# Altium schematic symbol library jlcpcb_2025_04_capacitors_extended_0603.schlib: 3668 symbols (part 20 of 20) (continued)
## V106M0603X5R250NKT
designator C?  Capacitance: 10uF  (hidden comment: *)
Capacitor, Ceramic (MLCC), 10uF, 25V, X5R, SMD 0603; Manufacturer: VIIYONG; Manufacturer Part Number: V106M0603X5R250NKT; Package Size: 0603; JLCPCB Basic Part: No; JLCPCB Part Number: C5240381; Supplier 1: LCSC; Category: Capacitors - MLCC; Supplier Part Number 1: C5240381; Voltage Rating: 25V; Temperature Coefficient: X5R; RoHS: Yes; ComponentLink1Description: Datasheet; ComponentLink1URL: https://wmsc.lcsc.com/wmsc/upload/file/pdf/v2/lcsc/2210281800_VIIYONG-V106M0603X5R250NKT_C5240381.pdf; ComponentLink2Description: JLCPCB Part URL; ComponentLink2URL: https://jlcpcb.com/partdetail/C5240381; ComponentLink3Description: LCSC Part URL; ComponentLink3URL: https://lcsc.com/product-detail/Multilayer-Ceramic-Capacitors-MLCC---SMD-SMT_VIIYONG-VIIYONG-V106M0603X5R250NKT_C5240381.html
footprint CAP-0603 (0603 (1608M) Capacitor)
pins: 1, 2

## V225K0603X5R160NDT
designator C?  Capacitance: 2.2uF  (hidden comment: *)
Capacitor, Ceramic (MLCC), 2.2uF, 16V, SMD 0603; Manufacturer: VIIYONG; Manufacturer Part Number: V225K0603X5R160NDT; Package Size: 0603; JLCPCB Basic Part: No; JLCPCB Part Number: C2691406; Supplier 1: LCSC; Category: Capacitors - MLCC; Supplier Part Number 1: C2691406; Voltage Rating: 16V; RoHS: Yes; ComponentLink1Description: Datasheet; ComponentLink1URL: https://wmsc.lcsc.com/wmsc/upload/file/pdf/v2/lcsc/2304140030_VIIYONG-V225K0603X5R160NDT_C2691406.pdf; ComponentLink2Description: JLCPCB Part URL; ComponentLink2URL: https://jlcpcb.com/partdetail/C2691406; ComponentLink3Description: LCSC Part URL; ComponentLink3URL: https://lcsc.com/product-detail/Multilayer-Ceramic-Capacitors-MLCC---SMD-SMT_VIIYONG-VIIYONG-V225K0603X5R160NDT_C2691406.html
footprint CAP-0603 (0603 (1608M) Capacitor)
pins: 1, 2

## V226M0603X5R6R3NKT
designator C?  Capacitance: 22uF  (hidden comment: *)
Capacitor, Ceramic (MLCC), 22uF, ±20%, 6.3V, X5R, ±20%, SMD 0603; Manufacturer: VIIYONG; Manufacturer Part Number: V226M0603X5R6R3NKT; Package Size: 0603; JLCPCB Basic Part: No; JLCPCB Part Number: C2975902; Supplier 1: LCSC; Category: Capacitors - MLCC; Supplier Part Number 1: C2975902; Tolerance: ±20%; Voltage Rating: 6.3V; Temperature Coefficient: X5R; RoHS: Yes; ComponentLink1Description: Datasheet; ComponentLink1URL: https://wmsc.lcsc.com/wmsc/upload/file/pdf/v2/lcsc/2202181430_VIIYONG-V226M0603X5R6R3NKT_C2975902.pdf; ComponentLink2Description: JLCPCB Part URL; ComponentLink2URL: https://jlcpcb.com/partdetail/C2975902; ComponentLink3Description: LCSC Part URL; ComponentLink3URL: https://lcsc.com/product-detail/Multilayer-Ceramic-Capacitors-MLCC---SMD-SMT_VIIYONG-VIIYONG-V226M0603X5R6R3NKT_C2975902.html
footprint CAP-0603 (0603 (1608M) Capacitor)
pins: 1, 2

## V226M0603X5R100N4R
designator C?  Capacitance: 22uF  (hidden comment: *)
Capacitor, Ceramic (MLCC), 22uF, 10V, X5R, SMD 0603; Manufacturer: VIIYONG; Manufacturer Part Number: V226M0603X5R100N4R; Package Size: 0603; JLCPCB Basic Part: No; JLCPCB Part Number: C2980393; Supplier 1: LCSC; Category: Capacitors - MLCC; Supplier Part Number 1: C2980393; Voltage Rating: 10V; Temperature Coefficient: X5R; RoHS: Yes; ComponentLink1Description: Datasheet; ComponentLink1URL: https://wmsc.lcsc.com/wmsc/upload/file/pdf/v2/lcsc/2203071730_VIIYONG-V226M0603X5R100N4R_C2980393.pdf; ComponentLink2Description: JLCPCB Part URL; ComponentLink2URL: https://jlcpcb.com/partdetail/C2980393; ComponentLink3Description: LCSC Part URL; ComponentLink3URL: https://lcsc.com/product-detail/Multilayer-Ceramic-Capacitors-MLCC---SMD-SMT_VIIYONG-VIIYONG-V226M0603X5R100N4R_C2980393.html
footprint CAP-0603 (0603 (1608M) Capacitor)
pins: 1, 2

## V226M0603X5R100NKT
designator C?  Capacitance: 22uF  (hidden comment: *)
Capacitor, Ceramic (MLCC), 22uF, 10V, X5R, SMD 0603; Manufacturer: VIIYONG; Manufacturer Part Number: V226M0603X5R100NKT; Package Size: 0603; JLCPCB Basic Part: No; JLCPCB Part Number: C5240384; Supplier 1: LCSC; Category: Capacitors - MLCC; Supplier Part Number 1: C5240384; Voltage Rating: 10V; Temperature Coefficient: X5R; RoHS: Yes; ComponentLink1Description: Datasheet; ComponentLink1URL: https://wmsc.lcsc.com/wmsc/upload/file/pdf/v2/lcsc/2210281800_VIIYONG-V226M0603X5R100NKT_C5240384.pdf; ComponentLink2Description: JLCPCB Part URL; ComponentLink2URL: https://jlcpcb.com/partdetail/C5240384; ComponentLink3Description: LCSC Part URL; ComponentLink3URL: https://lcsc.com/product-detail/Multilayer-Ceramic-Capacitors-MLCC---SMD-SMT_VIIYONG-VIIYONG-V226M0603X5R100NKT_C5240384.html
footprint CAP-0603 (0603 (1608M) Capacitor)
pins: 1, 2

## V226M0603X6S6R3NWR
designator C?  Capacitance: 22uF  (hidden comment: *)
Capacitor, Ceramic (MLCC), 22uF, ±20%, 6.3V, X6S, ±20%, SMD 0603; Manufacturer: VIIYONG; Manufacturer Part Number: V226M0603X6S6R3NWR; Package Size: 0603; JLCPCB Basic Part: No; JLCPCB Part Number: C3009907; Supplier 1: LCSC; Category: Capacitors - MLCC; Supplier Part Number 1: C3009907; Tolerance: ±20%; Voltage Rating: 6.3V; Temperature Coefficient: X6S; RoHS: Yes; ComponentLink1Description: Datasheet; ComponentLink1URL: https://wmsc.lcsc.com/wmsc/upload/file/pdf/v2/lcsc/2205171745_VIIYONG-V226M0603X6S6R3NWR_C3009907.pdf; ComponentLink2Description: JLCPCB Part URL; ComponentLink2URL: https://jlcpcb.com/partdetail/C3009907; ComponentLink3Description: LCSC Part URL; ComponentLink3URL: https://lcsc.com/product-detail/Multilayer-Ceramic-Capacitors-MLCC---SMD-SMT_VIIYONG-VIIYONG-V226M0603X6S6R3NWR_C3009907.html
footprint CAP-0603 (0603 (1608M) Capacitor)
pins: 1, 2

## V475K0603X5R6R3NDT
designator C?  Capacitance: 4.7uF  (hidden comment: *)
Capacitor, Ceramic (MLCC), 4.7uF, 6.3V, X5R, SMD 0603; Manufacturer: VIIYONG; Manufacturer Part Number: V475K0603X5R6R3NDT; Package Size: 0603; JLCPCB Basic Part: No; JLCPCB Part Number: C5240386; Supplier 1: LCSC; Category: Capacitors - MLCC; Supplier Part Number 1: C5240386; Voltage Rating: 6.3V; Temperature Coefficient: X5R; RoHS: Yes; ComponentLink1Description: Datasheet; ComponentLink1URL: https://wmsc.lcsc.com/wmsc/upload/file/pdf/v2/lcsc/2210281800_VIIYONG-V475K0603X5R6R3NDT_C5240386.pdf; ComponentLink2Description: JLCPCB Part URL; ComponentLink2URL: https://jlcpcb.com/partdetail/C5240386; ComponentLink3Description: LCSC Part URL; ComponentLink3URL: https://lcsc.com/product-detail/Multilayer-Ceramic-Capacitors-MLCC---SMD-SMT_VIIYONG-VIIYONG-V475K0603X5R6R3NDT_C5240386.html
footprint CAP-0603 (0603 (1608M) Capacitor)
pins: 1, 2

## V475K0603X5R100NDT
designator C?  Capacitance: 4.7uF  (hidden comment: *)
Capacitor, Ceramic (MLCC), 4.7uF, 10V, X5R, SMD 0603; Manufacturer: VIIYONG; Manufacturer Part Number: V475K0603X5R100NDT; Package Size: 0603; JLCPCB Basic Part: No; JLCPCB Part Number: C2980395; Supplier 1: LCSC; Category: Capacitors - MLCC; Supplier Part Number 1: C2980395; Voltage Rating: 10V; Temperature Coefficient: X5R; RoHS: Yes; ComponentLink1Description: Datasheet; ComponentLink1URL: https://wmsc.lcsc.com/wmsc/upload/file/pdf/v2/lcsc/2203041530_VIIYONG-V475K0603X5R100NDT_C2980395.pdf; ComponentLink2Description: JLCPCB Part URL; ComponentLink2URL: https://jlcpcb.com/partdetail/C2980395; ComponentLink3Description: LCSC Part URL; ComponentLink3URL: https://lcsc.com/product-detail/Multilayer-Ceramic-Capacitors-MLCC---SMD-SMT_VIIYONG-VIIYONG-V475K0603X5R100NDT_C2980395.html
footprint CAP-0603 (0603 (1608M) Capacitor)
pins: 1, 2

## V475K0603X5R160NDT
designator C?  Capacitance: 4.7uF  (hidden comment: *)
Capacitor, Ceramic (MLCC), 4.7uF, 16V, X5R, SMD 0603; Manufacturer: VIIYONG; Manufacturer Part Number: V475K0603X5R160NDT; Package Size: 0603; JLCPCB Basic Part: No; JLCPCB Part Number: C2980396; Supplier 1: LCSC; Category: Capacitors - MLCC; Supplier Part Number 1: C2980396; Voltage Rating: 16V; Temperature Coefficient: X5R; RoHS: Yes; ComponentLink1Description: Datasheet; ComponentLink1URL: https://wmsc.lcsc.com/wmsc/upload/file/pdf/v2/lcsc/2203041530_VIIYONG-V475K0603X5R160NDT_C2980396.pdf; ComponentLink2Description: JLCPCB Part URL; ComponentLink2URL: https://jlcpcb.com/partdetail/C2980396; ComponentLink3Description: LCSC Part URL; ComponentLink3URL: https://lcsc.com/product-detail/Multilayer-Ceramic-Capacitors-MLCC---SMD-SMT_VIIYONG-VIIYONG-V475K0603X5R160NDT_C2980396.html
footprint CAP-0603 (0603 (1608M) Capacitor)
pins: 1, 2

## V475K0603X7R6R3NET
designator C?  Capacitance: 4.7uF  (hidden comment: *)
Capacitor, Ceramic (MLCC), 4.7uF, ±10%, 6.3V, X7R, ±10%, SMD 0603; Manufacturer: VIIYONG; Manufacturer Part Number: V475K0603X7R6R3NET; Package Size: 0603; JLCPCB Basic Part: No; JLCPCB Part Number: C2976057; Supplier 1: LCSC; Category: Capacitors - MLCC; Supplier Part Number 1: C2976057; Tolerance: ±10%; Voltage Rating: 6.3V; Temperature Coefficient: X7R; RoHS: Yes; ComponentLink1Description: Datasheet; ComponentLink1URL: https://wmsc.lcsc.com/wmsc/upload/file/pdf/v2/lcsc/2202211830_VIIYONG-V475K0603X7R6R3NET_C2976057.pdf; ComponentLink2Description: JLCPCB Part URL; ComponentLink2URL: https://jlcpcb.com/partdetail/C2976057; ComponentLink3Description: LCSC Part URL; ComponentLink3URL: https://lcsc.com/product-detail/Multilayer-Ceramic-Capacitors-MLCC---SMD-SMT_VIIYONG-VIIYONG-V475K0603X7R6R3NET_C2976057.html
footprint CAP-0603 (0603 (1608M) Capacitor)
pins: 1, 2

## V475M0603X5R6R3NDT
designator C?  Capacitance: 4.7uF  (hidden comment: *)
Capacitor, Ceramic (MLCC), 4.7uF, ±20%, 6.3V, X5R, ±20%, SMD 0603; Manufacturer: VIIYONG; Manufacturer Part Number: V475M0603X5R6R3NDT; Package Size: 0603; JLCPCB Basic Part: No; JLCPCB Part Number: C5252399; Supplier 1: LCSC; Category: Capacitors - MLCC; Supplier Part Number 1: C5252399; Tolerance: ±20%; Voltage Rating: 6.3V; Temperature Coefficient: X5R; RoHS: Yes; ComponentLink1Description: Datasheet; ComponentLink1URL: https://wmsc.lcsc.com/wmsc/upload/file/pdf/v2/lcsc/2211101800_VIIYONG-V475M0603X5R6R3NDT_C5252399.pdf; ComponentLink2Description: JLCPCB Part URL; ComponentLink2URL: https://jlcpcb.com/partdetail/C5252399; ComponentLink3Description: LCSC Part URL; ComponentLink3URL: https://lcsc.com/product-detail/Multilayer-Ceramic-Capacitors-MLCC---SMD-SMT_VIIYONG-VIIYONG-V475M0603X5R6R3NDT_C5252399.html
footprint CAP-0603 (0603 (1608M) Capacitor)
pins: 1, 2

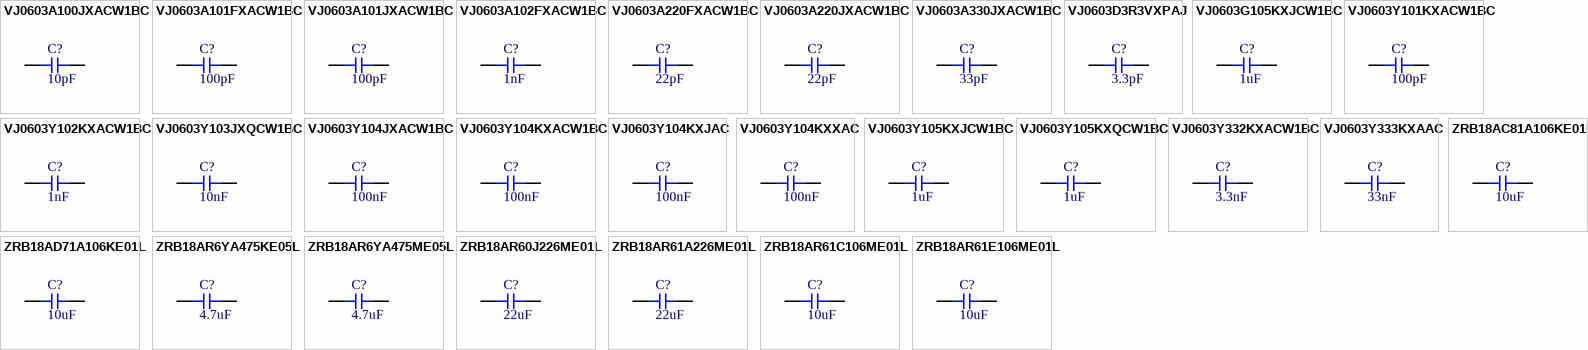
[diagram p91: symbols VJ0603A100JXACW1BC to ZRB18AR61E106ME01L]

## VJ0603A100JXACW1BC
designator C?  Capacitance: 10pF  (hidden comment: *)
Capacitor, Ceramic (MLCC), 10pF, ±5%, 50V, C0G, ±5%, SMD 0603; Manufacturer: Vishay Intertech; Manufacturer Part Number: VJ0603A100JXACW1BC; Package Size: 0603; JLCPCB Basic Part: No; JLCPCB Part Number: C2171298; Supplier 1: LCSC; Category: Capacitors - MLCC; Supplier Part Number 1: C2171298; Tolerance: ±5%; Voltage Rating: 50V; Temperature Coefficient: C0G; RoHS: Yes; ComponentLink1Description: Datasheet; ComponentLink1URL: https://wmsc.lcsc.com/wmsc/upload/file/pdf/v2/lcsc/2304140030_Vishay-Intertech-VJ0603A100JXACW1BC_C2171298.pdf; ComponentLink2Description: JLCPCB Part URL; ComponentLink2URL: https://jlcpcb.com/partdetail/C2171298; ComponentLink3Description: LCSC Part URL; ComponentLink3URL: https://lcsc.com/product-detail/Multilayer-Ceramic-Capacitors-MLCC---SMD-SMT_Vishay-Intertech-Vishay-Intertech-VJ0603A100JXACW1BC_C2171298.html
footprint CAP-0603 (0603 (1608M) Capacitor)
pins: 1, 2

## VJ0603A101FXACW1BC
designator C?  Capacitance: 100pF  (hidden comment: *)
Capacitor, Ceramic (MLCC), 100pF, ±1%, 50V, C0G, ±1%, SMD 0603; Manufacturer: Vishay Intertech; Manufacturer Part Number: VJ0603A101FXACW1BC; Package Size: 0603; JLCPCB Basic Part: No; JLCPCB Part Number: C2180415; Supplier 1: LCSC; Category: Capacitors - MLCC; Supplier Part Number 1: C2180415; Tolerance: ±1%; Voltage Rating: 50V; Temperature Coefficient: C0G; RoHS: Yes; ComponentLink1Description: Datasheet; ComponentLink1URL: https://wmsc.lcsc.com/wmsc/upload/file/pdf/v2/lcsc/2304140030_Vishay-Intertech-VJ0603A101FXACW1BC_C2180415.pdf; ComponentLink2Description: JLCPCB Part URL; ComponentLink2URL: https://jlcpcb.com/partdetail/C2180415; ComponentLink3Description: LCSC Part URL; ComponentLink3URL: https://lcsc.com/product-detail/Multilayer-Ceramic-Capacitors-MLCC---SMD-SMT_Vishay-Intertech-Vishay-Intertech-VJ0603A101FXACW1BC_C2180415.html
footprint CAP-0603 (0603 (1608M) Capacitor)
pins: 1, 2

## VJ0603A101JXACW1BC
designator C?  Capacitance: 100pF  (hidden comment: *)
Capacitor, Ceramic (MLCC), 100pF, ±5%, 50V, NP0, ±5%, SMD 0603; Manufacturer: Vishay Intertech; Manufacturer Part Number: VJ0603A101JXACW1BC; Package Size: 0603; JLCPCB Basic Part: No; JLCPCB Part Number: C3151700; Supplier 1: LCSC; Category: Capacitors - MLCC; Supplier Part Number 1: C3151700; Tolerance: ±5%; Voltage Rating: 50V; Temperature Coefficient: NP0; RoHS: Yes; ComponentLink1Description: Datasheet; ComponentLink1URL: https://wmsc.lcsc.com/wmsc/upload/file/pdf/v2/lcsc/2206291701_Vishay-Intertech-VJ0603A101JXACW1BC_C3151700.pdf; ComponentLink2Description: JLCPCB Part URL; ComponentLink2URL: https://jlcpcb.com/partdetail/C3151700; ComponentLink3Description: LCSC Part URL; ComponentLink3URL: https://lcsc.com/product-detail/Multilayer-Ceramic-Capacitors-MLCC---SMD-SMT_Vishay-Intertech-Vishay-Intertech-VJ0603A101JXACW1BC_C3151700.html
footprint CAP-0603 (0603 (1608M) Capacitor)
pins: 1, 2

## VJ0603A102FXACW1BC
designator C?  Capacitance: 1nF  (hidden comment: *)
Capacitor, Ceramic (MLCC), 1nF, ±1%, 50V, C0G, ±1%, SMD 0603; Manufacturer: Vishay Intertech; Manufacturer Part Number: VJ0603A102FXACW1BC; Package Size: 0603; JLCPCB Basic Part: No; JLCPCB Part Number: C2174671; Supplier 1: LCSC; Category: Capacitors - MLCC; Supplier Part Number 1: C2174671; Tolerance: ±1%; Voltage Rating: 50V; Temperature Coefficient: C0G; RoHS: Yes; ComponentLink1Description: Datasheet; ComponentLink1URL: https://wmsc.lcsc.com/wmsc/upload/file/pdf/v2/lcsc/2304140030_Vishay-Intertech-VJ0603A102FXACW1BC_C2174671.pdf; ComponentLink2Description: JLCPCB Part URL; ComponentLink2URL: https://jlcpcb.com/partdetail/C2174671; ComponentLink3Description: LCSC Part URL; ComponentLink3URL: https://lcsc.com/product-detail/Multilayer-Ceramic-Capacitors-MLCC---SMD-SMT_Vishay-Intertech-Vishay-Intertech-VJ0603A102FXACW1BC_C2174671.html
footprint CAP-0603 (0603 (1608M) Capacitor)
pins: 1, 2

## VJ0603A220FXACW1BC
designator C?  Capacitance: 22pF  (hidden comment: *)
Capacitor, Ceramic (MLCC), 22pF, ±1%, 50V, C0G, ±1%, SMD 0603; Manufacturer: Vishay Intertech; Manufacturer Part Number: VJ0603A220FXACW1BC; Package Size: 0603; JLCPCB Basic Part: No; JLCPCB Part Number: C2182228; Supplier 1: LCSC; Category: Capacitors - MLCC; Supplier Part Number 1: C2182228; Tolerance: ±1%; Voltage Rating: 50V; Temperature Coefficient: C0G; RoHS: Yes; ComponentLink1Description: Datasheet; ComponentLink1URL: https://wmsc.lcsc.com/wmsc/upload/file/pdf/v2/lcsc/2304140030_Vishay-Intertech-VJ0603A220FXACW1BC_C2182228.pdf; ComponentLink2Description: JLCPCB Part URL; ComponentLink2URL: https://jlcpcb.com/partdetail/C2182228; ComponentLink3Description: LCSC Part URL; ComponentLink3URL: https://lcsc.com/product-detail/Multilayer-Ceramic-Capacitors-MLCC---SMD-SMT_Vishay-Intertech-Vishay-Intertech-VJ0603A220FXACW1BC_C2182228.html
footprint CAP-0603 (0603 (1608M) Capacitor)
pins: 1, 2

## VJ0603A220JXACW1BC
designator C?  Capacitance: 22pF  (hidden comment: *)
Capacitor, Ceramic (MLCC), 22pF, ±5%, 50V, C0G, ±5%, SMD 0603; Manufacturer: Vishay Intertech; Manufacturer Part Number: VJ0603A220JXACW1BC; Package Size: 0603; JLCPCB Basic Part: No; JLCPCB Part Number: C2168905; Supplier 1: LCSC; Category: Capacitors - MLCC; Supplier Part Number 1: C2168905; Tolerance: ±5%; Voltage Rating: 50V; Temperature Coefficient: C0G; RoHS: Yes; ComponentLink1Description: Datasheet; ComponentLink1URL: https://wmsc.lcsc.com/wmsc/upload/file/pdf/v2/lcsc/2304140030_Vishay-Intertech-VJ0603A220JXACW1BC_C2168905.pdf; ComponentLink2Description: JLCPCB Part URL; ComponentLink2URL: https://jlcpcb.com/partdetail/C2168905; ComponentLink3Description: LCSC Part URL; ComponentLink3URL: https://lcsc.com/product-detail/Multilayer-Ceramic-Capacitors-MLCC---SMD-SMT_Vishay-Intertech-Vishay-Intertech-VJ0603A220JXACW1BC_C2168905.html
footprint CAP-0603 (0603 (1608M) Capacitor)
pins: 1, 2

## VJ0603A330JXACW1BC
designator C?  Capacitance: 33pF  (hidden comment: *)
Capacitor, Ceramic (MLCC), 33pF, ±5%, 50V, C0G, ±5%, SMD 0603; Manufacturer: Vishay Intertech; Manufacturer Part Number: VJ0603A330JXACW1BC; Package Size: 0603; JLCPCB Basic Part: No; JLCPCB Part Number: C3878228; Supplier 1: LCSC; Category: Capacitors - MLCC; Supplier Part Number 1: C3878228; Tolerance: ±5%; Voltage Rating: 50V; Temperature Coefficient: C0G; RoHS: Yes; ComponentLink1Description: Datasheet; ComponentLink1URL: https://wmsc.lcsc.com/wmsc/upload/file/pdf/v2/lcsc/2312121652_Vishay-Intertech-VJ0603A330JXACW1BC_C3878228.pdf; ComponentLink2Description: JLCPCB Part URL; ComponentLink2URL: https://jlcpcb.com/partdetail/C3878228; ComponentLink3Description: LCSC Part URL; ComponentLink3URL: https://lcsc.com/product-detail/Multilayer-Ceramic-Capacitors-MLCC---SMD-SMT_Vishay-Intertech-Vishay-Intertech-VJ0603A330JXACW1BC_C3878228.html
footprint CAP-0603 (0603 (1608M) Capacitor)
pins: 1, 2

## VJ0603D3R3VXPAJ
designator C?  Capacitance: 3.3pF  (hidden comment: *)
Capacitor, Ceramic (MLCC), 3.3pF, 50V, C0G, SMD 0603; Manufacturer: Vishay Intertech; Manufacturer Part Number: VJ0603D3R3VXPAJ; Package Size: 0603; JLCPCB Basic Part: No; JLCPCB Part Number: C3000798; Supplier 1: LCSC; Category: Capacitors - MLCC; Supplier Part Number 1: C3000798; Voltage Rating: 50V; Temperature Coefficient: C0G; RoHS: Yes; ComponentLink1Description: Datasheet; ComponentLink1URL: https://wmsc.lcsc.com/wmsc/upload/file/pdf/v2/lcsc/2204251600_Vishay-Intertech-VJ0603D3R3VXPAJ_C3000798.pdf; ComponentLink2Description: JLCPCB Part URL; ComponentLink2URL: https://jlcpcb.com/partdetail/C3000798; ComponentLink3Description: LCSC Part URL; ComponentLink3URL: https://lcsc.com/product-detail/Multilayer-Ceramic-Capacitors-MLCC---SMD-SMT_Vishay-Intertech-Vishay-Intertech-VJ0603D3R3VXPAJ_C3000798.html
footprint CAP-0603 (0603 (1608M) Capacitor)
pins: 1, 2

## VJ0603G105KXJCW1BC
designator C?  Capacitance: 1uF  (hidden comment: *)
Capacitor, Ceramic (MLCC), 1uF, ±10%, 16V, X5R, ±10%, SMD 0603; Manufacturer: Vishay Intertech; Manufacturer Part Number: VJ0603G105KXJCW1BC; Package Size: 0603; JLCPCB Basic Part: No; JLCPCB Part Number: C272771; Supplier 1: LCSC; Category: Capacitors - MLCC; Supplier Part Number 1: C272771; Tolerance: ±10%; Voltage Rating: 16V; Temperature Coefficient: X5R; RoHS: Yes; ComponentLink1Description: Datasheet; ComponentLink1URL: https://wmsc.lcsc.com/wmsc/upload/file/pdf/v2/lcsc/1810051510_Vishay-Intertech-VJ0603G105KXJCW1BC_C272771.pdf; ComponentLink2Description: JLCPCB Part URL; ComponentLink2URL: https://jlcpcb.com/partdetail/C272771; ComponentLink3Description: LCSC Part URL; ComponentLink3URL: https://lcsc.com/product-detail/Multilayer-Ceramic-Capacitors-MLCC---SMD-SMT_Vishay-Intertech-Vishay-Intertech-VJ0603G105KXJCW1BC_C272771.html
footprint CAP-0603 (0603 (1608M) Capacitor)
pins: 1, 2

## VJ0603Y101KXACW1BC
designator C?  Capacitance: 100pF  (hidden comment: *)
Capacitor, Ceramic (MLCC), 100pF, ±10%, 50V, X7R, ±10%, SMD 0603; Manufacturer: Vishay Intertech; Manufacturer Part Number: VJ0603Y101KXACW1BC; Package Size: 0603; JLCPCB Basic Part: No; JLCPCB Part Number: C2169528; Supplier 1: LCSC; Category: Capacitors - MLCC; Supplier Part Number 1: C2169528; Tolerance: ±10%; Voltage Rating: 50V; Temperature Coefficient: X7R; RoHS: Yes; ComponentLink1Description: Datasheet; ComponentLink1URL: https://wmsc.lcsc.com/wmsc/upload/file/pdf/v2/lcsc/2304140030_Vishay-Intertech-VJ0603Y101KXACW1BC_C2169528.pdf; ComponentLink2Description: JLCPCB Part URL; ComponentLink2URL: https://jlcpcb.com/partdetail/C2169528; ComponentLink3Description: LCSC Part URL; ComponentLink3URL: https://lcsc.com/product-detail/Multilayer-Ceramic-Capacitors-MLCC---SMD-SMT_Vishay-Intertech-Vishay-Intertech-VJ0603Y101KXACW1BC_C2169528.html
footprint CAP-0603 (0603 (1608M) Capacitor)
pins: 1, 2

## VJ0603Y102KXACW1BC
designator C?  Capacitance: 1nF  (hidden comment: *)
Capacitor, Ceramic (MLCC), 1nF, ±10%, 50V, X7R, ±10%, SMD 0603; Manufacturer: Vishay Intertech; Manufacturer Part Number: VJ0603Y102KXACW1BC; Package Size: 0603; JLCPCB Basic Part: No; JLCPCB Part Number: C153794; Supplier 1: LCSC; Category: Capacitors - MLCC; Supplier Part Number 1: C153794; Tolerance: ±10%; Voltage Rating: 50V; Temperature Coefficient: X7R; RoHS: Yes; ComponentLink1Description: Datasheet; ComponentLink1URL: https://wmsc.lcsc.com/wmsc/upload/file/pdf/v2/lcsc/2304140030_Vishay-Intertech-VJ0603Y102KXACW1BC_C153794.pdf; ComponentLink2Description: JLCPCB Part URL; ComponentLink2URL: https://jlcpcb.com/partdetail/C153794; ComponentLink3Description: LCSC Part URL; ComponentLink3URL: https://lcsc.com/product-detail/Multilayer-Ceramic-Capacitors-MLCC---SMD-SMT_Vishay-Intertech-Vishay-Intertech-VJ0603Y102KXACW1BC_C153794.html
footprint CAP-0603 (0603 (1608M) Capacitor)
pins: 1, 2

## VJ0603Y103JXQCW1BC
designator C?  Capacitance: 10nF  (hidden comment: *)
Capacitor, Ceramic (MLCC), 10nF, ±5%, 10V, X7R, ±5%, SMD 0603; Manufacturer: Vishay Intertech; Manufacturer Part Number: VJ0603Y103JXQCW1BC; Package Size: 0603; JLCPCB Basic Part: No; JLCPCB Part Number: C3000826; Supplier 1: LCSC; Category: Capacitors - MLCC; Supplier Part Number 1: C3000826; Tolerance: ±5%; Voltage Rating: 10V; Temperature Coefficient: X7R; RoHS: Yes; ComponentLink1Description: Datasheet; ComponentLink1URL: https://wmsc.lcsc.com/wmsc/upload/file/pdf/v2/lcsc/2204251600_Vishay-Intertech-VJ0603Y103JXQCW1BC_C3000826.pdf; ComponentLink2Description: JLCPCB Part URL; ComponentLink2URL: https://jlcpcb.com/partdetail/C3000826; ComponentLink3Description: LCSC Part URL; ComponentLink3URL: https://lcsc.com/product-detail/Multilayer-Ceramic-Capacitors-MLCC---SMD-SMT_Vishay-Intertech-Vishay-Intertech-VJ0603Y103JXQCW1BC_C3000826.html
footprint CAP-0603 (0603 (1608M) Capacitor)
pins: 1, 2

## VJ0603Y104JXACW1BC
designator C?  Capacitance: 100nF  (hidden comment: *)
Capacitor, Ceramic (MLCC), 100nF, ±5%, 50V, X7R, ±5%, SMD 0603; Manufacturer: Vishay Intertech; Manufacturer Part Number: VJ0603Y104JXACW1BC; Package Size: 0603; JLCPCB Basic Part: No; JLCPCB Part Number: C167641; Supplier 1: LCSC; Category: Capacitors - MLCC; Supplier Part Number 1: C167641; Tolerance: ±5%; Voltage Rating: 50V; Temperature Coefficient: X7R; RoHS: Yes; ComponentLink1Description: Datasheet; ComponentLink1URL: https://wmsc.lcsc.com/wmsc/upload/file/pdf/v2/lcsc/1809291528_Vishay-Intertech-VJ0603Y104JXACW1BC_C167641.pdf; ComponentLink2Description: JLCPCB Part URL; ComponentLink2URL: https://jlcpcb.com/partdetail/C167641; ComponentLink3Description: LCSC Part URL; ComponentLink3URL: https://lcsc.com/product-detail/Multilayer-Ceramic-Capacitors-MLCC---SMD-SMT_Vishay-Intertech-Vishay-Intertech-VJ0603Y104JXACW1BC_C167641.html
footprint CAP-0603 (0603 (1608M) Capacitor)
pins: 1, 2

## VJ0603Y104KXACW1BC
designator C?  Capacitance: 100nF  (hidden comment: *)
Capacitor, Ceramic (MLCC), 100nF, ±10%, 50V, X7R, ±10%, SMD 0603; Manufacturer: Vishay Intertech; Manufacturer Part Number: VJ0603Y104KXACW1BC; Package Size: 0603; JLCPCB Basic Part: No; JLCPCB Part Number: C161854; Supplier 1: LCSC; Category: Capacitors - MLCC; Supplier Part Number 1: C161854; Tolerance: ±10%; Voltage Rating: 50V; Temperature Coefficient: X7R; RoHS: Yes; ComponentLink1Description: Datasheet; ComponentLink1URL: https://wmsc.lcsc.com/wmsc/upload/file/pdf/v2/lcsc/2304140030_Vishay-Intertech-VJ0603Y104KXACW1BC_C161854.pdf; ComponentLink2Description: JLCPCB Part URL; ComponentLink2URL: https://jlcpcb.com/partdetail/C161854; ComponentLink3Description: LCSC Part URL; ComponentLink3URL: https://lcsc.com/product-detail/Multilayer-Ceramic-Capacitors-MLCC---SMD-SMT_Vishay-Intertech-Vishay-Intertech-VJ0603Y104KXACW1BC_C161854.html
footprint CAP-0603 (0603 (1608M) Capacitor)
pins: 1, 2

## VJ0603Y104KXJAC
designator C?  Capacitance: 100nF  (hidden comment: *)
Capacitor, Ceramic (MLCC), 100nF, ±10%, 16V, X7R, ±10%, SMD 0603; Manufacturer: Vishay Intertech; Manufacturer Part Number: VJ0603Y104KXJAC; Package Size: 0603; JLCPCB Basic Part: No; JLCPCB Part Number: C165952; Supplier 1: LCSC; Category: Capacitors - MLCC; Supplier Part Number 1: C165952; Tolerance: ±10%; Voltage Rating: 16V; Temperature Coefficient: X7R; RoHS: Yes; ComponentLink1Description: Datasheet; ComponentLink1URL: https://wmsc.lcsc.com/wmsc/upload/file/pdf/v2/lcsc/1806111858_Vishay-Intertech-VJ0603Y104KXJAC_C165952.pdf; ComponentLink2Description: JLCPCB Part URL; ComponentLink2URL: https://jlcpcb.com/partdetail/C165952; ComponentLink3Description: LCSC Part URL; ComponentLink3URL: https://lcsc.com/product-detail/Multilayer-Ceramic-Capacitors-MLCC---SMD-SMT_Vishay-Intertech-Vishay-Intertech-VJ0603Y104KXJAC_C165952.html
footprint CAP-0603 (0603 (1608M) Capacitor)
pins: 1, 2

## VJ0603Y104KXXAC
designator C?  Capacitance: 100nF  (hidden comment: *)
Capacitor, Ceramic (MLCC), 100nF, ±10%, 25V, X7R, ±10%, SMD 0603; Manufacturer: Vishay Intertech; Manufacturer Part Number: VJ0603Y104KXXAC; Package Size: 0603; JLCPCB Basic Part: No; JLCPCB Part Number: C165951; Supplier 1: LCSC; Category: Capacitors - MLCC; Supplier Part Number 1: C165951; Tolerance: ±10%; Voltage Rating: 25V; Temperature Coefficient: X7R; RoHS: Yes; ComponentLink1Description: Datasheet; ComponentLink1URL: https://wmsc.lcsc.com/wmsc/upload/file/pdf/v2/lcsc/2304140030_Vishay-Intertech-VJ0603Y104KXXAC_C165951.pdf; ComponentLink2Description: JLCPCB Part URL; ComponentLink2URL: https://jlcpcb.com/partdetail/C165951; ComponentLink3Description: LCSC Part URL; ComponentLink3URL: https://lcsc.com/product-detail/Multilayer-Ceramic-Capacitors-MLCC---SMD-SMT_Vishay-Intertech-Vishay-Intertech-VJ0603Y104KXXAC_C165951.html
footprint CAP-0603 (0603 (1608M) Capacitor)
pins: 1, 2

## VJ0603Y105KXJCW1BC
designator C?  Capacitance: 1uF  (hidden comment: *)
Capacitor, Ceramic (MLCC), 1uF, ±10%, 16V, X7R, ±10%, SMD 0603; Manufacturer: Vishay Intertech; Manufacturer Part Number: VJ0603Y105KXJCW1BC; Package Size: 0603; JLCPCB Basic Part: No; JLCPCB Part Number: C2169543; Supplier 1: LCSC; Category: Capacitors - MLCC; Supplier Part Number 1: C2169543; Tolerance: ±10%; Voltage Rating: 16V; Temperature Coefficient: X7R; RoHS: Yes; ComponentLink1Description: Datasheet; ComponentLink1URL: https://wmsc.lcsc.com/wmsc/upload/file/pdf/v2/lcsc/2304140030_Vishay-Intertech-VJ0603Y105KXJCW1BC_C2169543.pdf; ComponentLink2Description: JLCPCB Part URL; ComponentLink2URL: https://jlcpcb.com/partdetail/C2169543; ComponentLink3Description: LCSC Part URL; ComponentLink3URL: https://lcsc.com/product-detail/Multilayer-Ceramic-Capacitors-MLCC---SMD-SMT_Vishay-Intertech-Vishay-Intertech-VJ0603Y105KXJCW1BC_C2169543.html
footprint CAP-0603 (0603 (1608M) Capacitor)
pins: 1, 2

## VJ0603Y105KXQCW1BC
designator C?  Capacitance: 1uF  (hidden comment: *)
Capacitor, Ceramic (MLCC), 1uF, ±10%, 10V, X7R, ±10%, SMD 0603; Manufacturer: Vishay Intertech; Manufacturer Part Number: VJ0603Y105KXQCW1BC; Package Size: 0603; JLCPCB Basic Part: No; JLCPCB Part Number: C3000819; Supplier 1: LCSC; Category: Capacitors - MLCC; Supplier Part Number 1: C3000819; Tolerance: ±10%; Voltage Rating: 10V; Temperature Coefficient: X7R; RoHS: Yes; ComponentLink1Description: Datasheet; ComponentLink1URL: https://wmsc.lcsc.com/wmsc/upload/file/pdf/v2/lcsc/2204251600_Vishay-Intertech-VJ0603Y105KXQCW1BC_C3000819.pdf; ComponentLink2Description: JLCPCB Part URL; ComponentLink2URL: https://jlcpcb.com/partdetail/C3000819; ComponentLink3Description: LCSC Part URL; ComponentLink3URL: https://lcsc.com/product-detail/Multilayer-Ceramic-Capacitors-MLCC---SMD-SMT_Vishay-Intertech-Vishay-Intertech-VJ0603Y105KXQCW1BC_C3000819.html
footprint CAP-0603 (0603 (1608M) Capacitor)
pins: 1, 2

## VJ0603Y332KXACW1BC
designator C?  Capacitance: 3.3nF  (hidden comment: *)
Capacitor, Ceramic (MLCC), 3.3nF, ±10%, 50V, X7R, ±10%, SMD 0603; Manufacturer: Vishay Intertech; Manufacturer Part Number: VJ0603Y332KXACW1BC; Package Size: 0603; JLCPCB Basic Part: No; JLCPCB Part Number: C167331; Supplier 1: LCSC; Category: Capacitors - MLCC; Supplier Part Number 1: C167331; Tolerance: ±10%; Voltage Rating: 50V; Temperature Coefficient: X7R; RoHS: Yes; ComponentLink1Description: Datasheet; ComponentLink1URL: https://wmsc.lcsc.com/wmsc/upload/file/pdf/v2/lcsc/2304140030_Vishay-Intertech-VJ0603Y332KXACW1BC_C167331.pdf; ComponentLink2Description: JLCPCB Part URL; ComponentLink2URL: https://jlcpcb.com/partdetail/C167331; ComponentLink3Description: LCSC Part URL; ComponentLink3URL: https://lcsc.com/product-detail/Multilayer-Ceramic-Capacitors-MLCC---SMD-SMT_Vishay-Intertech-Vishay-Intertech-VJ0603Y332KXACW1BC_C167331.html
footprint CAP-0603 (0603 (1608M) Capacitor)
pins: 1, 2

## VJ0603Y333KXAAC
designator C?  Capacitance: 33nF  (hidden comment: *)
Capacitor, Ceramic (MLCC), 33nF, ±10%, 50V, X7R, ±10%, SMD 0603; Manufacturer: Vishay Intertech; Manufacturer Part Number: VJ0603Y333KXAAC; Package Size: 0603; JLCPCB Basic Part: No; JLCPCB Part Number: C1850710; Supplier 1: LCSC; Category: Capacitors - MLCC; Supplier Part Number 1: C1850710; Tolerance: ±10%; Voltage Rating: 50V; Temperature Coefficient: X7R; RoHS: Yes; ComponentLink1Description: Datasheet; ComponentLink1URL: https://wmsc.lcsc.com/wmsc/upload/file/pdf/v2/lcsc/2304140030_Vishay-Intertech-VJ0603Y333KXAAC_C1850710.pdf; ComponentLink2Description: JLCPCB Part URL; ComponentLink2URL: https://jlcpcb.com/partdetail/C1850710; ComponentLink3Description: LCSC Part URL; ComponentLink3URL: https://lcsc.com/product-detail/Multilayer-Ceramic-Capacitors-MLCC---SMD-SMT_Vishay-Intertech-Vishay-Intertech-VJ0603Y333KXAAC_C1850710.html
footprint CAP-0603 (0603 (1608M) Capacitor)
pins: 1, 2

## ZRB18AC81A106KE01L
designator C?  Capacitance: 10uF  (hidden comment: *)
Capacitor, Ceramic (MLCC), 10uF, ±10%, 10V, X6S, ±10%, SMD 0603; Manufacturer: Murata Electronics; Manufacturer Part Number: ZRB18AC81A106KE01L; Package Size: 0603; JLCPCB Basic Part: No; JLCPCB Part Number: C2167716; Supplier 1: LCSC; Category: Capacitors - MLCC; Supplier Part Number 1: C2167716; Tolerance: ±10%; Voltage Rating: 10V; Temperature Coefficient: X6S; RoHS: Yes; ComponentLink1Description: Datasheet; ComponentLink1URL: https://wmsc.lcsc.com/wmsc/upload/file/pdf/v2/lcsc/2202040230_Murata-Electronics-ZRB18AC81A106KE01L_C2167716.pdf; ComponentLink2Description: JLCPCB Part URL; ComponentLink2URL: https://jlcpcb.com/partdetail/C2167716; ComponentLink3Description: LCSC Part URL; ComponentLink3URL: https://lcsc.com/product-detail/Multilayer-Ceramic-Capacitors-MLCC---SMD-SMT_Murata-Electronics-Murata-Electronics-ZRB18AC81A106KE01L_C2167716.html
footprint CAP-0603 (0603 (1608M) Capacitor)
pins: 1, 2

## ZRB18AD71A106KE01L
designator C?  Capacitance: 10uF  (hidden comment: *)
Capacitor, Ceramic (MLCC), 10uF, ±10%, 10V, X7T, ±10%, SMD 0603; Manufacturer: Murata Electronics; Manufacturer Part Number: ZRB18AD71A106KE01L; Package Size: 0603; JLCPCB Basic Part: No; JLCPCB Part Number: C703693; Supplier 1: LCSC; Category: Capacitors - MLCC; Supplier Part Number 1: C703693; Tolerance: ±10%; Voltage Rating: 10V; Temperature Coefficient: X7T; RoHS: Yes; ComponentLink1Description: Datasheet; ComponentLink1URL: https://wmsc.lcsc.com/wmsc/upload/file/pdf/v2/lcsc/2008101235_Murata-Electronics-ZRB18AD71A106KE01L_C703693.pdf; ComponentLink2Description: JLCPCB Part URL; ComponentLink2URL: https://jlcpcb.com/partdetail/C703693; ComponentLink3Description: LCSC Part URL; ComponentLink3URL: https://lcsc.com/product-detail/Multilayer-Ceramic-Capacitors-MLCC---SMD-SMT_Murata-Electronics-Murata-Electronics-ZRB18AD71A106KE01L_C703693.html
footprint CAP-0603 (0603 (1608M) Capacitor)
pins: 1, 2

## ZRB18AR6YA475KE05L
designator C?  Capacitance: 4.7uF  (hidden comment: *)
Capacitor, Ceramic (MLCC), 4.7uF, ±10%, 35V, X5R, ±10%, SMD 0603; Manufacturer: Murata Electronics; Manufacturer Part Number: ZRB18AR6YA475KE05L; Package Size: 0603; JLCPCB Basic Part: No; JLCPCB Part Number: C2167235; Supplier 1: LCSC; Category: Capacitors - MLCC; Supplier Part Number 1: C2167235; Tolerance: ±10%; Voltage Rating: 35V; Temperature Coefficient: X5R; RoHS: Yes; ComponentLink1Description: Datasheet; ComponentLink1URL: https://wmsc.lcsc.com/wmsc/upload/file/pdf/v2/lcsc/2108051530_Murata-Electronics-ZRB18AR6YA475KE05L_C2167235.pdf; ComponentLink2Description: JLCPCB Part URL; ComponentLink2URL: https://jlcpcb.com/partdetail/C2167235; ComponentLink3Description: LCSC Part URL; ComponentLink3URL: https://lcsc.com/product-detail/Multilayer-Ceramic-Capacitors-MLCC---SMD-SMT_Murata-Electronics-Murata-Electronics-ZRB18AR6YA475KE05L_C2167235.html
footprint CAP-0603 (0603 (1608M) Capacitor)
pins: 1, 2

## ZRB18AR6YA475ME05L
designator C?  Capacitance: 4.7uF  (hidden comment: *)
Capacitor, Ceramic (MLCC), 4.7uF, ±20%, 35V, X5R, ±20%, SMD 0603; Manufacturer: Murata Electronics; Manufacturer Part Number: ZRB18AR6YA475ME05L; Package Size: 0603; JLCPCB Basic Part: No; JLCPCB Part Number: C2171286; Supplier 1: LCSC; Category: Capacitors - MLCC; Supplier Part Number 1: C2171286; Tolerance: ±20%; Voltage Rating: 35V; Temperature Coefficient: X5R; RoHS: Yes; ComponentLink1Description: Datasheet; ComponentLink1URL: https://wmsc.lcsc.com/wmsc/upload/file/pdf/v2/lcsc/2202040500_Murata-Electronics-ZRB18AR6YA475ME05L_C2171286.pdf; ComponentLink2Description: JLCPCB Part URL; ComponentLink2URL: https://jlcpcb.com/partdetail/C2171286; ComponentLink3Description: LCSC Part URL; ComponentLink3URL: https://lcsc.com/product-detail/Multilayer-Ceramic-Capacitors-MLCC---SMD-SMT_Murata-Electronics-Murata-Electronics-ZRB18AR6YA475ME05L_C2171286.html
footprint CAP-0603 (0603 (1608M) Capacitor)
pins: 1, 2

## ZRB18AR60J226ME01L
designator C?  Capacitance: 22uF  (hidden comment: *)
Capacitor, Ceramic (MLCC), 22uF, ±20%, 6.3V, X5R, ±20%, SMD 0603; Manufacturer: Murata Electronics; Manufacturer Part Number: ZRB18AR60J226ME01L; Package Size: 0603; JLCPCB Basic Part: No; JLCPCB Part Number: C913515; Supplier 1: LCSC; Category: Capacitors - MLCC; Supplier Part Number 1: C913515; Tolerance: ±20%; Voltage Rating: 6.3V; Temperature Coefficient: X5R; RoHS: Yes; ComponentLink1Description: Datasheet; ComponentLink1URL: https://wmsc.lcsc.com/wmsc/upload/file/pdf/v2/lcsc/2012081136_Murata-Electronics-ZRB18AR60J226ME01L_C913515.pdf; ComponentLink2Description: JLCPCB Part URL; ComponentLink2URL: https://jlcpcb.com/partdetail/C913515; ComponentLink3Description: LCSC Part URL; ComponentLink3URL: https://lcsc.com/product-detail/Multilayer-Ceramic-Capacitors-MLCC---SMD-SMT_Murata-Electronics-Murata-Electronics-ZRB18AR60J226ME01L_C913515.html
footprint CAP-0603 (0603 (1608M) Capacitor)
pins: 1, 2

## ZRB18AR61A226ME01L
designator C?  Capacitance: 22uF  (hidden comment: *)
Capacitor, Ceramic (MLCC), 22uF, ±20%, 10V, X5R, ±20%, SMD 0603; Manufacturer: Murata Electronics; Manufacturer Part Number: ZRB18AR61A226ME01L; Package Size: 0603; JLCPCB Basic Part: No; JLCPCB Part Number: C162690; Supplier 1: LCSC; Category: Capacitors - MLCC; Supplier Part Number 1: C162690; Tolerance: ±20%; Voltage Rating: 10V; Temperature Coefficient: X5R; RoHS: Yes; ComponentLink1Description: Datasheet; ComponentLink1URL: https://wmsc.lcsc.com/wmsc/upload/file/pdf/v2/lcsc/1810311126_Murata-Electronics-ZRB18AR61A226ME01L_C162690.pdf; ComponentLink2Description: JLCPCB Part URL; ComponentLink2URL: https://jlcpcb.com/partdetail/C162690; ComponentLink3Description: LCSC Part URL; ComponentLink3URL: https://lcsc.com/product-detail/Multilayer-Ceramic-Capacitors-MLCC---SMD-SMT_Murata-Electronics-Murata-Electronics-ZRB18AR61A226ME01L_C162690.html
footprint CAP-0603 (0603 (1608M) Capacitor)
pins: 1, 2

## ZRB18AR61C106ME01L
designator C?  Capacitance: 10uF  (hidden comment: *)
Capacitor, Ceramic (MLCC), 10uF, ±20%, 16V, X5R, ±20%, SMD 0603; Manufacturer: Murata Electronics; Manufacturer Part Number: ZRB18AR61C106ME01L; Package Size: 0603; JLCPCB Basic Part: No; JLCPCB Part Number: C441753; Supplier 1: LCSC; Category: Capacitors - MLCC; Supplier Part Number 1: C441753; Tolerance: ±20%; Voltage Rating: 16V; Temperature Coefficient: X5R; RoHS: Yes; ComponentLink1Description: Datasheet; ComponentLink1URL: https://wmsc.lcsc.com/wmsc/upload/file/pdf/v2/lcsc/2010201503_Murata-Electronics-ZRB18AR61C106ME01L_C441753.pdf; ComponentLink2Description: JLCPCB Part URL; ComponentLink2URL: https://jlcpcb.com/partdetail/C441753; ComponentLink3Description: LCSC Part URL; ComponentLink3URL: https://lcsc.com/product-detail/Multilayer-Ceramic-Capacitors-MLCC---SMD-SMT_Murata-Electronics-Murata-Electronics-ZRB18AR61C106ME01L_C441753.html
footprint CAP-0603 (0603 (1608M) Capacitor)
pins: 1, 2

## ZRB18AR61E106ME01L
designator C?  Capacitance: 10uF  (hidden comment: *)
Capacitor, Ceramic (MLCC), 10uF, ±20%, 25V, X5R, ±20%, SMD 0603; Manufacturer: Murata Electronics; Manufacturer Part Number: ZRB18AR61E106ME01L; Package Size: 0603; JLCPCB Basic Part: No; JLCPCB Part Number: C913517; Supplier 1: LCSC; Category: Capacitors - MLCC; Supplier Part Number 1: C913517; Tolerance: ±20%; Voltage Rating: 25V; Temperature Coefficient: X5R; RoHS: Yes; ComponentLink1Description: Datasheet; ComponentLink1URL: https://wmsc.lcsc.com/wmsc/upload/file/pdf/v2/lcsc/2201131300_Murata-Electronics-ZRB18AR61E106ME01L_C913517.pdf; ComponentLink2Description: JLCPCB Part URL; ComponentLink2URL: https://jlcpcb.com/partdetail/C913517; ComponentLink3Description: LCSC Part URL; ComponentLink3URL: https://lcsc.com/product-detail/Multilayer-Ceramic-Capacitors-MLCC---SMD-SMT_Murata-Electronics-Murata-Electronics-ZRB18AR61E106ME01L_C913517.html
footprint CAP-0603 (0603 (1608M) Capacitor)
pins: 1, 2